# Altium footprint library CAP_TH.PcbLib: 220 footprints (part 5 of 14)
Each footprint in its own frame and in the unit in brackets; x right, y up, seen from the top. Pads: shape width x height; smd on the part's side, far side on the other; paste and mask are expansions set on the pad; w line width, h text height; cw(c..) or ccw(c..) is an arc to the next point about the centre after c.
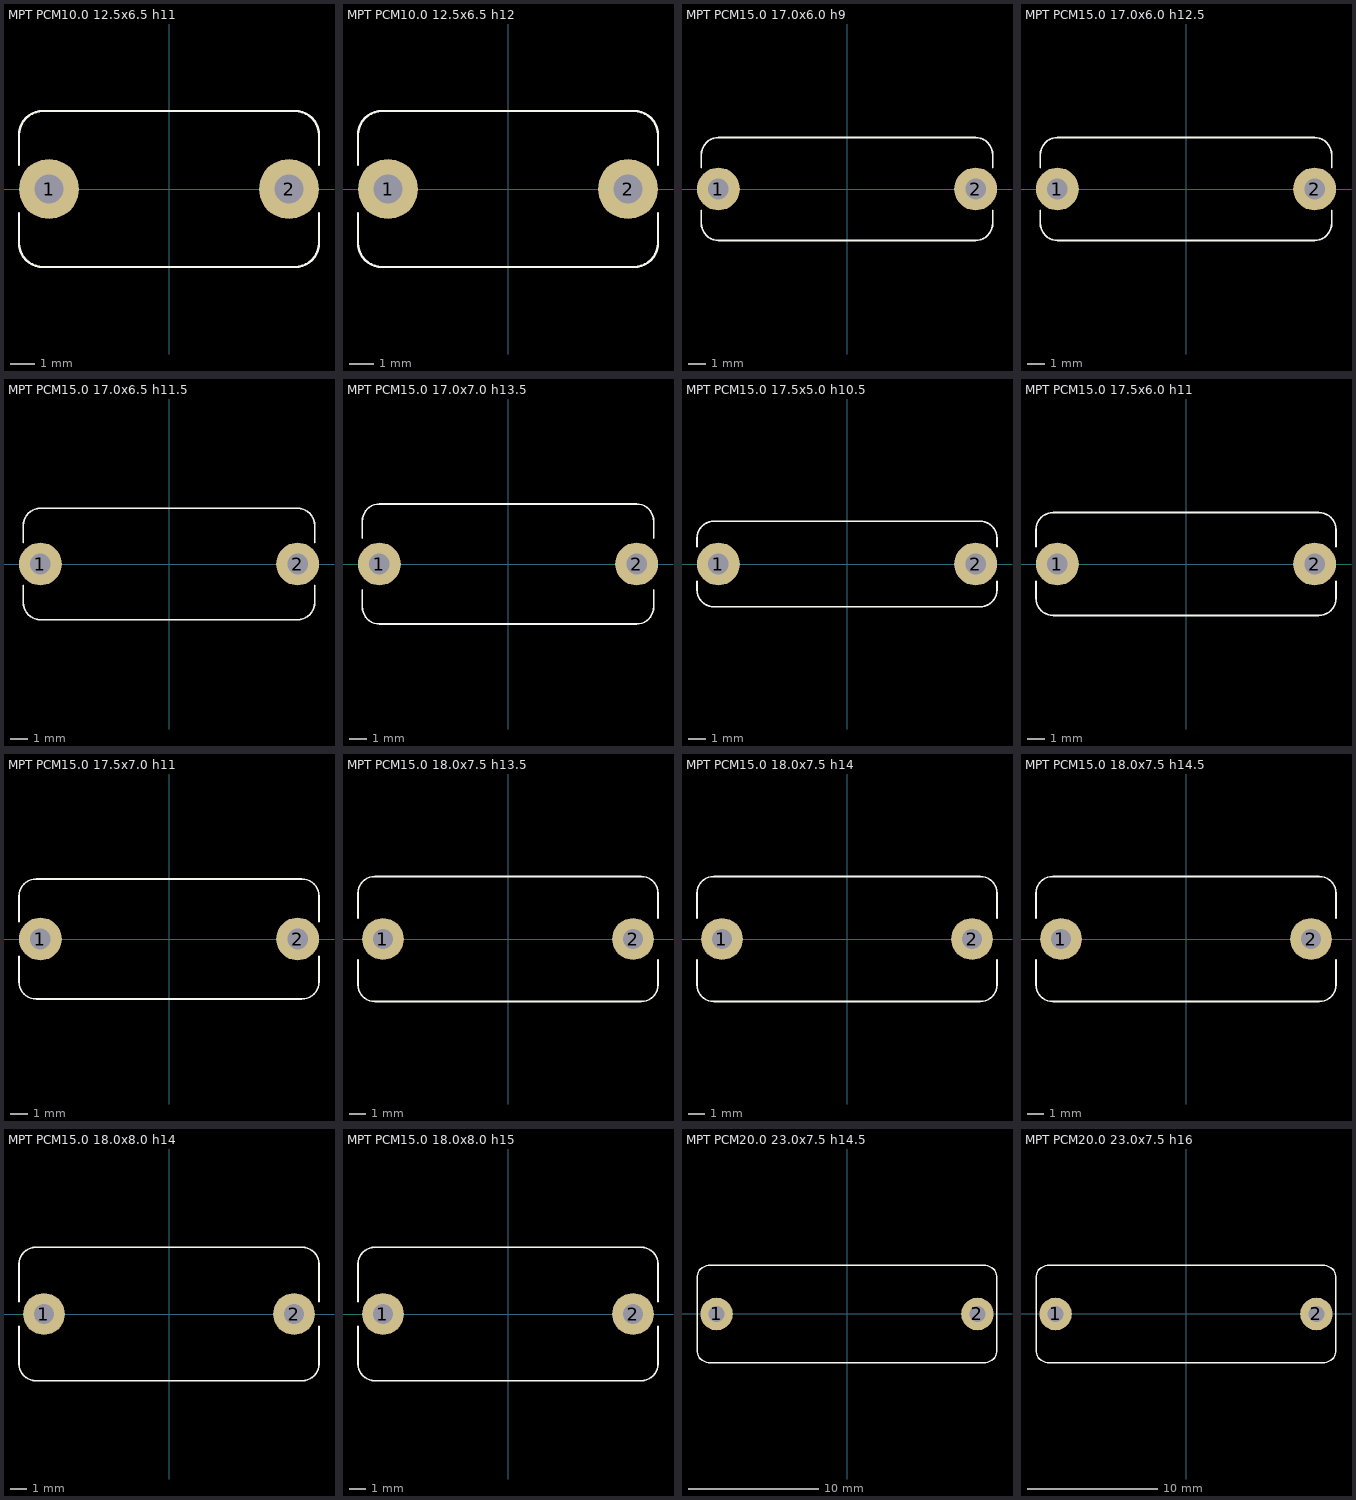
[diagram p4: the footprints below, top view; thin cyan lines are the x and y axes]

## MPT PCM10.0 12.5x6.5 h11 [mm]
pads (2):
  round 2.5 hole 1.2: 1(-5,0) 2(5,0)
Top Overlay:
  lines w0.1: -6.25,-1 -6.25,-2.25 ccw(c-5.25,-2.25) -5.25,-3.25 5.25,-3.25 ccw(c5.25,-2.25) 6.25,-2.25 6.25,-1 ; -6.25,1 -6.25,2.25 cw(c-5.25,2.25) -5.25,3.25 5.25,3.25 cw(c5.25,2.25) 6.25,2.25 6.25,1
3D body "MPT PCM10.0 12.5x6.5 h11.STEP": height 13, standoff -2, extent -6.25,-3.25 6.25,3.25

## MPT PCM10.0 12.5x6.5 h12 [mm]
pads (2):
  round 2.5 hole 1.2: 1(-5,0) 2(5,0)
Top Overlay:
  lines w0.1: -6.25,-1 -6.25,-2.25 ccw(c-5.25,-2.25) -5.25,-3.25 5.25,-3.25 ccw(c5.25,-2.25) 6.25,-2.25 6.25,-1 ; -6.25,1 -6.25,2.25 cw(c-5.25,2.25) -5.25,3.25 5.25,3.25 cw(c5.25,2.25) 6.25,2.25 6.25,1
3D body "MPT PCM10.0 12.5x6.5 h12.STEP": height 14, standoff -2, extent -6.25,-3.25 6.25,3.25

## MPT PCM15.0 17.0x6.0 h9 [mm]
pads (2):
  round 2.5 hole 1.2: 1(-7.5,0) 2(7.5,0)
Top Overlay:
  lines w0.1: -8.5,-1.25 -8.5,-2 ccw(c-7.5,-2) -7.5,-3 7.5,-3 ccw(c7.5,-2) 8.5,-2 8.5,-1.25 ; -8.5,1.25 -8.5,2 cw(c-7.5,2) -7.5,3 7.5,3 cw(c7.5,2) 8.5,2 8.5,1.25
3D body "MPT PCM15.0 17.0x6.0 h9.STEP": height 11, standoff -2, extent -8.5,-3 8.5,3

## MPT PCM15.0 17.0x6.0 h12.5 [mm]
pads (2):
  round 2.5 hole 1.2: 1(-7.5,0) 2(7.5,0)
Top Overlay:
  lines w0.1: -8.5,-1.25 -8.5,-2 ccw(c-7.5,-2) -7.5,-3 7.5,-3 ccw(c7.5,-2) 8.5,-2 8.5,-1.25 ; -8.5,1.25 -8.5,2 cw(c-7.5,2) -7.5,3 7.5,3 cw(c7.5,2) 8.5,2 8.5,1.25
3D body "MPT PCM15.0 17.0x6.0 h12.5.STEP": height 13.5, standoff -3, extent -8.5,-3 8.5,3

## MPT PCM15.0 17.0x6.5 h11.5 [mm]
pads (2):
  round 2.5 hole 1.2: 1(-7.5,0) 2(7.5,0)
Top Overlay:
  lines w0.1: -8.5,-1.25 -8.5,-2.25 ccw(c-7.5,-2.25) -7.5,-3.25 7.5,-3.25 ccw(c7.5,-2.25) 8.5,-2.25 8.5,-1.25 ; -8.5,1.25 -8.5,2.25 cw(c-7.5,2.25) -7.5,3.25 7.5,3.25 cw(c7.5,2.25) 8.5,2.25 8.5,1.25
3D body "MPT PCM15.0 17.0x6.5 h11.5.STEP": height 13.5, standoff -2, extent -8.5,-3.25 8.5,3.25

## MPT PCM15.0 17.0x7.0 h13.5 [mm]
pads (2):
  round 2.5 hole 1.2: 1(-7.5,0) 2(7.5,0)
Top Overlay:
  lines w0.1: -8.5,-1.5 -8.5,-2.5 ccw(c-7.5,-2.5) -7.5,-3.5 7.5,-3.5 ccw(c7.5,-2.5) 8.5,-2.5 8.5,-1.5 ; -8.5,1.5 -8.5,2.5 cw(c-7.5,2.5) -7.5,3.5 7.5,3.5 cw(c7.5,2.5) 8.5,2.5 8.5,1.5
3D body "MPT PCM15.0 17.0x7.0 h13.5.STEP": height 15.5, standoff -2, extent -8.5,-3.5 8.5,3.5

## MPT PCM15.0 17.5x5.0 h10.5 [mm]
pads (2):
  round 2.5 hole 1.2: 1(-7.5,0) 2(7.5,0)
Top Overlay:
  lines w0.1: -8.75,-1 -8.75,-1.5 ccw(c-7.75,-1.5) -7.75,-2.5 7.75,-2.5 ccw(c7.75,-1.5) 8.75,-1.5 8.75,-1 ; -8.75,1 -8.75,1.5 cw(c-7.75,1.5) -7.75,2.5 7.75,2.5 cw(c7.75,1.5) 8.75,1.5 8.75,1
3D body "MPT PCM15.0 17.5x5.0 h10.5.STEP": height 12.5, standoff -2, extent -8.75,-2.5 8.75,2.5

## MPT PCM15.0 17.5x6.0 h11 [mm]
pads (2):
  round 2.5 hole 1.2: 1(-7.5,0) 2(7.5,0)
Top Overlay:
  lines w0.1: -8.75,-1 -8.75,-2 ccw(c-7.75,-2) -7.75,-3 7.75,-3 ccw(c7.75,-2) 8.75,-2 8.75,-1 ; -8.75,1 -8.75,2 cw(c-7.75,2) -7.75,3 7.75,3 cw(c7.75,2) 8.75,2 8.75,1
3D body "MPT PCM15.0 17.5x6.0 h11.STEP": height 13, standoff -2, extent -8.75,-3 8.75,3

## MPT PCM15.0 17.5x7.0 h11 [mm]
pads (2):
  round 2.5 hole 1.2: 1(-7.5,0) 2(7.5,0)
Top Overlay:
  lines w0.1: -8.75,-1 -8.75,-2.5 ccw(c-7.75,-2.5) -7.75,-3.5 7.75,-3.5 ccw(c7.75,-2.5) 8.75,-2.5 8.75,-1 ; -8.75,1 -8.75,2.5 cw(c-7.75,2.5) -7.75,3.5 7.75,3.5 cw(c7.75,2.5) 8.75,2.5 8.75,1
3D body "MPT PCM15.0 17.5x7.0 h11.STEP": height 13, standoff -2, extent -8.75,-3.5 8.75,3.5

## MPT PCM15.0 18.0x7.5 h13.5 [mm]
pads (2):
  round 2.5 hole 1.2: 1(-7.5,0) 2(7.5,0)
Top Overlay:
  lines w0.1: -9,-1.25 -9,-2.75 ccw(c-8,-2.75) -8,-3.75 8,-3.75 ccw(c8,-2.75) 9,-2.75 9,-1.25 ; -9,1.25 -9,2.75 cw(c-8,2.75) -8,3.75 8,3.75 cw(c8,2.75) 9,2.75 9,1.25
3D body "MPT PCM15.0 18.0x7.5 h13.5.STEP": height 15.5, standoff -2, extent -9,-3.75 9,3.75

## MPT PCM15.0 18.0x7.5 h14 [mm]
pads (2):
  round 2.5 hole 1.2: 1(-7.5,0) 2(7.5,0)
Top Overlay:
  lines w0.1: -9,-1.25 -9,-2.75 ccw(c-8,-2.75) -8,-3.75 8,-3.75 ccw(c8,-2.75) 9,-2.75 9,-1.25 ; -9,1.25 -9,2.75 cw(c-8,2.75) -8,3.75 8,3.75 cw(c8,2.75) 9,2.75 9,1.25
3D body "MPT PCM15.0 18.0x7.5 h14.STEP": height 16, standoff -2, extent -9,-3.75 9,3.75

## MPT PCM15.0 18.0x7.5 h14.5 [mm]
pads (2):
  round 2.5 hole 1.2: 1(-7.5,0) 2(7.5,0)
Top Overlay:
  lines w0.1: -9,-1.25 -9,-2.75 ccw(c-8,-2.75) -8,-3.75 8,-3.75 ccw(c8,-2.75) 9,-2.75 9,-1.25 ; -9,1.25 -9,2.75 cw(c-8,2.75) -8,3.75 8,3.75 cw(c8,2.75) 9,2.75 9,1.25
3D body "MPT PCM15.0 18.0x7.5 h14.5.STEP": height 16.5, standoff -2, extent -9,-3.75 9,3.75

## MPT PCM15.0 18.0x8.0 h14 [mm]
pads (2):
  round 2.5 hole 1.2: 1(-7.5,0) 2(7.5,0)
Top Overlay:
  lines w0.1: -9,-0.75 -9,-3 ccw(c-8,-3) -8,-4 8,-4 ccw(c8,-3) 9,-3 9,-0.75 ; -9,0.75 -9,3 cw(c-8,3) -8,4 8,4 cw(c8,3) 9,3 9,0.75
3D body "MPT PCM15.0 18.0x8.0 h14.STEP": height 16, standoff -2, extent -9,-4 9,4

## MPT PCM15.0 18.0x8.0 h15 [mm]
pads (2):
  round 2.5 hole 1.2: 1(-7.5,0) 2(7.5,0)
Top Overlay:
  lines w0.1: -9,-0.75 -9,-3 ccw(c-8,-3) -8,-4 8,-4 ccw(c8,-3) 9,-3 9,-0.75 ; -9,0.75 -9,3 cw(c-8,3) -8,4 8,4 cw(c8,3) 9,3 9,0.75
3D body "MPT PCM15.0 18.0x8.0 h15.STEP": height 17, standoff -2, extent -9,-4 9,4

## MPT PCM20.0 23.0x7.5 h14.5 [mm]
pads (2):
  round 2.5 hole 1.2: 1(-10,0) 2(10,0)
Top Overlay:
  lines w0.1: -11.5,-2.75 ccw(c-10.5,-2.75) -10.5,-3.75 10.5,-3.75 ccw(c10.5,-2.75) 11.5,-2.75 11.5,2.75 ccw(c10.5,2.75) 10.5,3.75 -10.5,3.75 ccw(c-10.5,2.75) -11.5,2.75 -11.5,-2.75
3D body "MPT PCM20.0 23.0x7.5 h14.5.STEP": height 16.5, standoff -2, extent -11.5,-3.75 11.5,3.75

## MPT PCM20.0 23.0x7.5 h16 [mm]
pads (2):
  round 2.5 hole 1.2: 1(-10,0) 2(10,0)
Top Overlay:
  lines w0.1: -11.5,-2.75 ccw(c-10.5,-2.75) -10.5,-3.75 10.5,-3.75 ccw(c10.5,-2.75) 11.5,-2.75 11.5,2.75 ccw(c10.5,2.75) 10.5,3.75 -10.5,3.75 ccw(c-10.5,2.75) -11.5,2.75 -11.5,-2.75
3D body "MPT PCM20.0 23.0x7.5 h16.STEP": height 18, standoff -2, extent -11.5,-3.75 11.5,3.75